# Altium footprint library PcbLib.PcbLib: 108 footprints (part 1 of 7)
Each footprint in its own frame and in the unit in brackets; x right, y up, seen from the top. Pads: shape width x height; smd on the part's side, far side on the other; paste and mask are expansions set on the pad; w line width, h text height; cw(c..) or ccw(c..) is an arc to the next point about the centre after c.
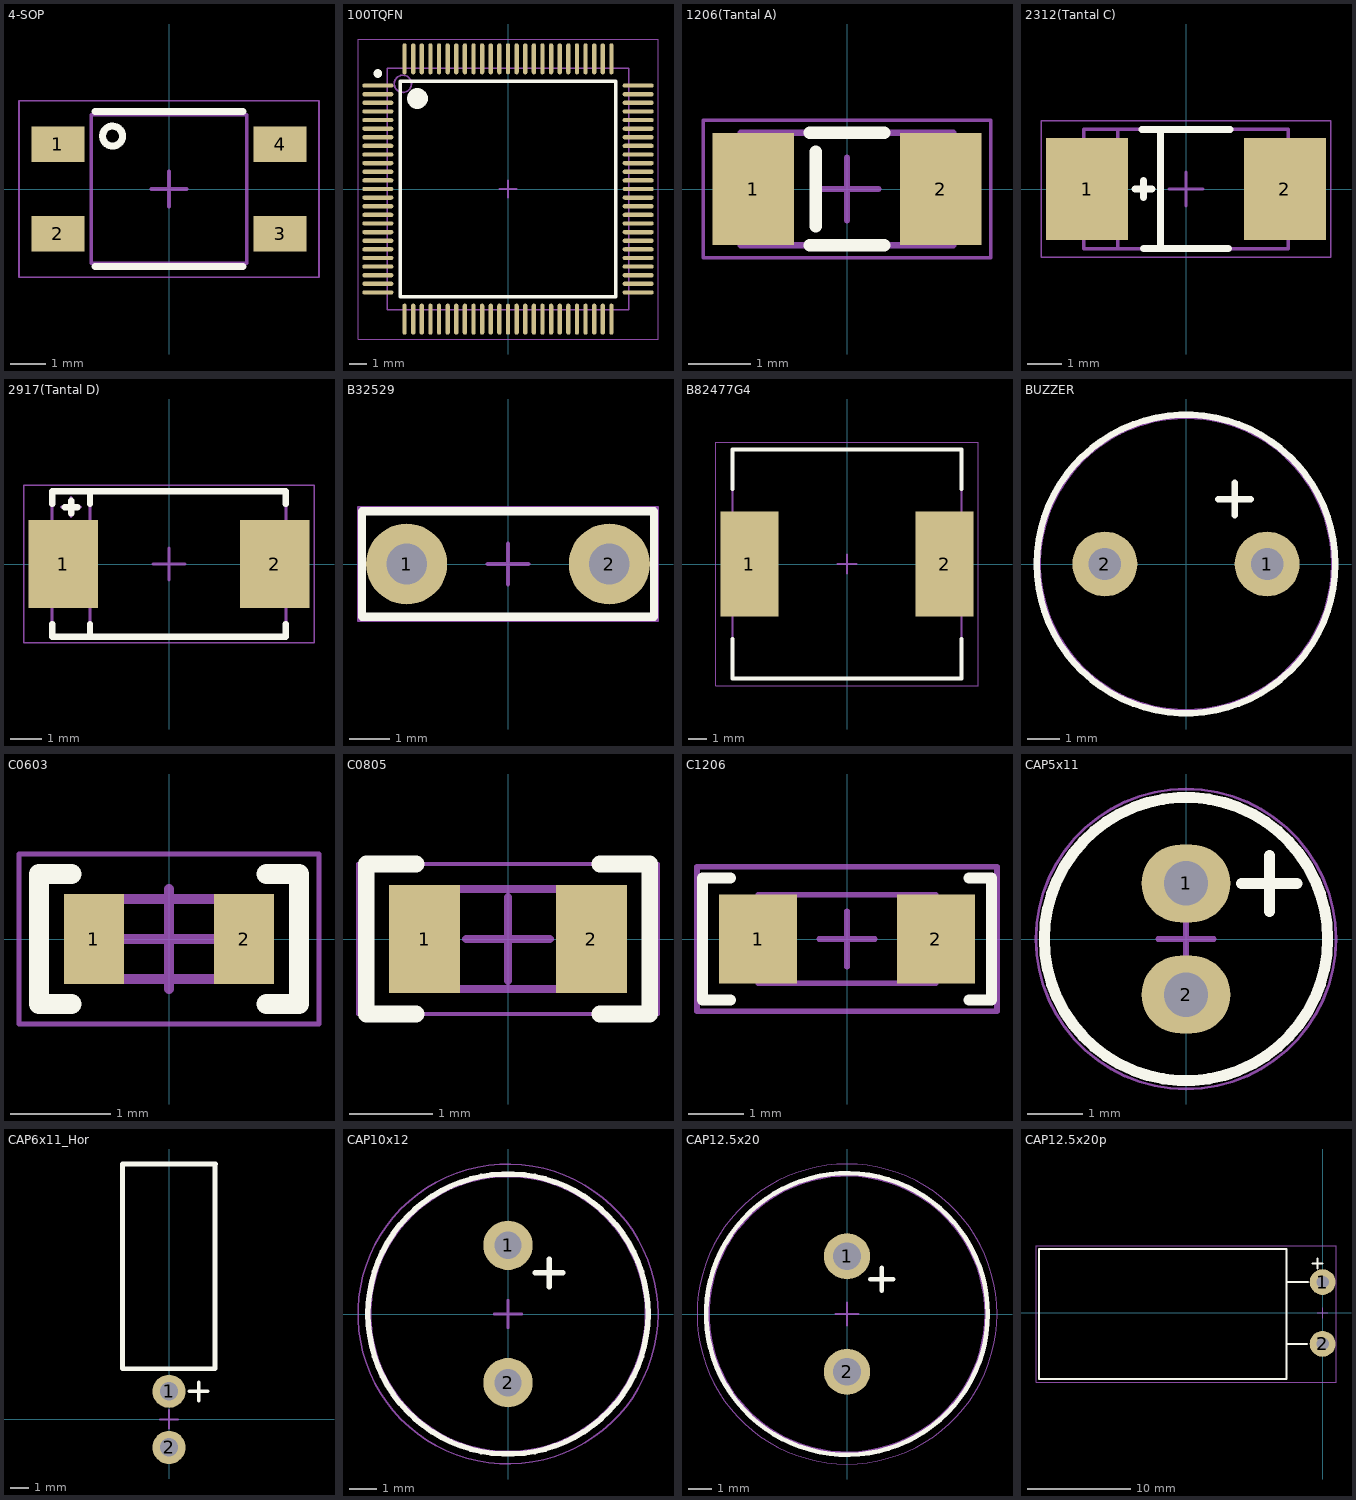
[diagram p0: the footprints below, top view; thin cyan lines are the x and y axes]

## 4-SOP [mm]
height 2
pads (4):
  rect 1.5x1 smd: 1(-3.15,1.27) 2(-3.15,-1.27) 3(3.15,-1.27) 4(3.15,1.27)
Top Overlay:
  circle w0.2: c-1.6,1.5 r0.283
  lines w0.2: -2.1,-2.2 2.1,-2.2 ; -2.1,2.2 2.1,2.2
Mechanical 13:
  lines w0.05: -4.25,-2.5 -4.25,2.5 4.25,2.5 4.25,-2.5 -4.25,-2.5
  lines w0.1: -0.5,0 0.5,0 ; 0,-0.5 0,0.5
Mechanical 14:
  circle w0.1: c-1.6,1.5 r0.3
  lines w0.1: -2.2,-2.1 2.2,-2.1 2.2,2.1 -2.2,2.1 -2.2,-2.1
3D body "4-SOP.STEP": height 2.1, standoff 0, extent -3.4,-2.15 3.4,2.15

## 100TQFN [mm] "Thin QFP, 100-Leads, Body 14x14mm, Pitch 0.5mm, IPC Medium Density"
height 1.2
pads (100):
  oval 1.8x0.25 smd: 1(-7.55,6) 2(-7.55,5.5) 3(-7.55,5) 4(-7.55,4.5) 5(-7.55,4) 6(-7.55,3.5) 7(-7.55,3) 8(-7.55,2.5) 9(-7.55,2) 10(-7.55,1.5) 11(-7.55,1) 12(-7.55,0.5) 13(-7.55,0) 14(-7.55,-0.5) 15(-7.55,-1) 16(-7.55,-1.5) 17(-7.55,-2) 18(-7.55,-2.5) 19(-7.55,-3) 20(-7.55,-3.5) 21(-7.55,-4) 22(-7.55,-4.5) 23(-7.55,-5) 24(-7.55,-5.5) 25(-7.55,-6) 51(7.55,-6) 52(7.55,-5.5) 53(7.55,-5) 54(7.55,-4.5) 55(7.55,-4) 56(7.55,-3.5) 57(7.55,-3) 58(7.55,-2.5) 59(7.55,-2) 60(7.55,-1.5) 61(7.55,-1) 62(7.55,-0.5) 63(7.55,0) 64(7.55,0.5) 65(7.55,1) 66(7.55,1.5) 67(7.55,2) 68(7.55,2.5) 69(7.55,3) 70(7.55,3.5) 71(7.55,4) 72(7.55,4.5) 73(7.55,5) 74(7.55,5.5) 75(7.55,6)
  oval 0.25x1.8 smd: 26(-6,-7.55) 27(-5.5,-7.55) 28(-5,-7.55) 29(-4.5,-7.55) 30(-4,-7.55) 31(-3.5,-7.55) 32(-3,-7.55) 33(-2.5,-7.55) 34(-2,-7.55) 35(-1.5,-7.55) 36(-1,-7.55) 37(-0.5,-7.55) 38(0,-7.55) 39(0.5,-7.55) 40(1,-7.55) 41(1.5,-7.55) 42(2,-7.55) 43(2.5,-7.55) 44(3,-7.55) 45(3.5,-7.55) 46(4,-7.55) 47(4.5,-7.55) 48(5,-7.55) 49(5.5,-7.55) 50(6,-7.55) 76(6,7.55) 77(5.5,7.55) 78(5,7.55) 79(4.5,7.55) 80(4,7.55) 81(3.5,7.55) 82(3,7.55) 83(2.5,7.55) 84(2,7.55) 85(1.5,7.55) 86(1,7.55) 87(0.5,7.55) 88(0,7.55) 89(-0.5,7.55) 90(-1,7.55) 91(-1.5,7.55) 92(-2,7.55) 93(-2.5,7.55) 94(-3,7.55) 95(-3.5,7.55) 96(-4,7.55) 97(-4.5,7.55) 98(-5,7.55) 99(-5.5,7.55) 100(-6,7.55)
Top Overlay:
  circle w0.6: c-5.25,5.25 r0.3
  circle w0.25: c-7.55,6.7 r0.125
  lines w0.2: -6.25,-6.25 6.25,-6.25 6.25,6.25 -6.25,6.25 -6.25,-6.25
Mechanical 13:
  lines w0.05: -8.7,-8.7 -8.7,8.7 8.7,8.7 8.7,-8.7 -8.7,-8.7
  lines w0.1: -0.5,0 0.5,0 ; 0,-0.5 0,0.5
Mechanical 14:
  circle w0.1: c-6.1,6.1 r0.5
  lines w0.1: -7,-7 7,-7 7,7 -7,7 -7,-7
3D body "User Library-100A-14x14.step": height 1.15, standoff 0.05, extent -8,-8 8,8

## 1206(Tantal A) [mm]
height 1.8
pads (2):
  rect 1.3x1.8 smd: 1(-1.5,0) 2(1.5,0)
Top Overlay:
  lines w0.2: -0.6,-0.9 0.6,-0.9 ; -0.6,0.9 0.6,0.9 ; -0.5,-0.6 -0.5,0.6
Mechanical 13:
  lines w0.05: -2.3,-1.1 2.3,-1.1 2.3,1.1 -2.3,1.1 -2.3,-1.1
  lines w0.1: -0.5,0 0.5,0 ; 0,-0.5 0,0.5
Mechanical 14:
  lines w0.1: -1,-0.9 -1,0.9 ; -1.7,-0.9 1.7,-0.9 1.7,0.9 -1.7,0.9 -1.7,-0.9
3D body "CAP_TANT_1206_A_case.step": height 1.7, standoff 0, extent -1.7,-0.9 1.7,0.9

## 2312(Tantal C) [mm]
height 2.9
pads (2):
  rect 2.4x3 smd: 1(-2.9,0) 2(2.9,0)
Top Overlay:
  lines w0.2: -1.5,0 -1,0 ; -1.3,1.75 1.3,1.75 ; -1.25,-1.75 1.25,-1.75 ; -1.25,-0.25 -1.25,0.25 ; -0.75,-1.75 -0.75,1.75
Mechanical 13:
  lines w0.05: -4.25,-2 4.25,-2 4.25,2 -4.25,2 -4.25,-2
  lines w0.1: -0.5,0 0.5,0 ; 0,-0.5 0,0.5
Mechanical 14:
  lines w0.1: -2,-1.75 -2,1.75 ; -1.5,0 -1,0 ; -1.25,-0.25 -1.25,0.25 ; -3,-1.75 3,-1.75 3,1.75 -3,1.75 -3,-1.75
3D body "CAP_TANT_C.step": height 2.6, standoff 0, extent -2.9,-1.6 2.9,1.6

## 2917(Tantal D) [mm]
height 2.9
pads (2):
  rect 2.2x2.8 smd: 1(-3.35,0) 2(3.35,0)
Top Overlay:
  lines w0.2: -3.7,-1.9 -3.7,-2.3 3.7,-2.3 3.7,-1.9 ; -3.7,1.9 -3.7,2.3 3.7,2.3 3.7,1.9 ; -3.3,1.8 -2.9,1.8 ; -3.1,1.6 -3.1,2 ; -2.5,-2.3 -2.5,-1.9 ; -2.5,1.9 -2.5,2.3
Mechanical 13:
  lines w0.05: -4.6,-2.5 4.6,-2.5 4.6,2.5 -4.6,2.5 -4.6,-2.5
  lines w0.1: -0.5,0 0.5,0 ; 0,-0.5 0,0.5
Mechanical 14:
  lines w0.1: -3.4,1.8 -2.8,1.8 ; -3.1,1.5 -3.1,2.1 ; -2.5,-2.3 -2.5,2.3 ; -3.7,-2.3 3.7,-2.3 3.7,2.3 -3.7,2.3 -3.7,-2.3
3D body "2917D_CASE.step": height 3.01, standoff 0, extent -3.7,-2.225 3.7,2.225

## B32529 [mm]
height 6.5
pads (2):
  round 2 hole 1: 1(-2.5,0) 2(2.5,0)
Top Overlay:
  lines w0.2: -3.6,-1.3 3.6,-1.3 3.6,1.3 -3.6,1.3 -3.6,-1.3
Mechanical 13:
  lines w0.05: -3.7,-1.4 -3.7,1.4 3.7,1.4 3.7,-1.4 -3.7,-1.4
  lines w0.1: -0.5,0 0.5,0 ; 0,-0.5 0,0.5
Mechanical 14:
  lines w0.1: -3.6,-1.3 3.6,-1.3 3.6,1.3 -3.6,1.3 -3.6,-1.3
3D body "User Library-B32529-2_5X6_5X7_2.STEP": height 6.5, standoff -3, extent -3.6,-1.25 3.6,1.25

## B82477G4 [mm]
height 8
pads (2):
  rect 3.1x5.6 smd: 1(-5.2,0) 2(5.2,0)
Top Overlay:
  lines w0.2: -6.1,-4 -6.1,-6.1 6.1,-6.1 6.1,-4 ; -6.1,4 -6.1,6.1 6.1,6.1 6.1,4
Mechanical 13:
  lines w0.05: -7,-6.5 -7,6.5 7,6.5 7,-6.5 -7,-6.5
  lines w0.1: -0.5,0 0.5,0 ; 0,-0.5 0,0.5
Mechanical 14:
  lines w0.1: -6.1,-6.1 -6.1,6.1 6.1,6.1 6.1,-6.1 -6.1,-6.1
3D body "User Library-CDRH127-2.step": height 8, standoff 0, extent -6,-6 6,6

## BUZZER [mm]
height 8
pads (2):
  round 2 hole 1: 1(2.5,0) 2(-2.5,0)
Top Overlay:
  circle w0.2: c0,0 r4.6
  lines w0.2: 1,2 2,2 ; 1.5,1.5 1.5,2.5
Mechanical 13:
  circle w0.05: c0,0 r4.623
Mechanical 14:
  circle w0.1: c0,0 r4.519
3D body "Buzzer_9mm.STEP": height 5.7, standoff -5.3, extent -4.55,-4.55 4.55,4.55

## C0603 [mm]
height 1
pads (2):
  rect 0.6x0.9 smd: 1(-0.75,0) 2(0.75,0)
Top Overlay:
  lines w0.2: -0.975,-0.65 -1.3,-0.65 -1.3,0.65 -0.975,0.65 ; 0.975,-0.65 1.3,-0.65 1.3,0.65 0.975,0.65
Mechanical 13:
  lines w0.05: -1.5,-0.85 1.5,-0.85 1.5,0.85 -1.5,0.85 -1.5,-0.85
  lines w0.1: -0.5,0 0.5,0 ; 0,-0.5 0,0.5
Mechanical 14:
  lines w0.1: -0.8,-0.4 0.7,-0.4 0.7,0.4 -0.8,0.4 -0.8,-0.4
3D body "User Library-cap_0603-1.step": height 0.8, standoff 0, extent -0.8,-0.4 0.8,0.4

## C0805 [mm]
height 1
pads (2):
  rect 0.85x1.3 smd: 1(-1,0) 2(1,0)
Top Overlay:
  lines w0.2: -1.1,-0.9 -1.7,-0.9 -1.7,0.9 -1.1,0.9 ; 1.1,-0.9 1.7,-0.9 1.7,0.9 1.1,0.9
Mechanical 13:
  lines w0.05: -1.8,-0.9 -1.8,0.9 1.8,0.9 1.8,-0.9 -1.8,-0.9
  lines w0.1: -0.5,0 0.5,0 ; 0,-0.5 0,0.5
Mechanical 14:
  lines w0.1: -1,-0.6 -1,0.6 1,0.6 1,-0.6 -1,-0.6
3D body "CircuitWorks-cap0805.step": height 0.6, standoff 0, extent -1,-0.625 1,0.625

## C1206 [mm]
height 1.25
pads (2):
  rect 1.4x1.6 smd: 1(-1.6,0) 2(1.6,0)
Top Overlay:
  lines w0.2: -2.1,-1.1 -2.6,-1.1 -2.6,1.1 -2.1,1.1 ; 2.2,-1.1 2.6,-1.1 2.6,1.1 2.2,1.1
Mechanical 13:
  lines w0.1: -0.5,0 0.5,0 ; 0,-0.5 0,0.5 ; -2.7,-1.3 -2.7,1.3 2.7,1.3 2.7,-1.3 -2.7,-1.3
Mechanical 14:
  lines w0.1: -1.6,-0.8 1.6,-0.8 1.6,0.8 -1.6,0.8 -1.6,-0.8
3D body "User Library-cap_1206_1_25.step": height 1.25, standoff 0, extent -1.6,-0.8 1.6,0.8

## CAP5x11 [mm] "2mm Pitch"
height 11.5
pads (2):
  oval 1.6x1.4 hole 0.8: 1(0,1) 2(0,-1)
Top Overlay:
  circle w0.2: c0,0 r2.55
  lines w0.2: 1,1 2,1 ; 1.5,0.5 1.5,1.5
Mechanical 13:
  circle w0.05: c0,0 r2.7
  lines w0.1: -0.5,0 0.5,0 ; 0,-0.5 0,0.5
Mechanical 14:
  circle w0.1: c0,0 r2.55
3D body "Cap-EL(5x11-2)T.step": height 11.35, standoff -2.45, extent -2.499,-2.502 2.499,2.5

## CAP6x11_Hor [mm] "2mm Pitch"
height 11.5
pads (2):
  round 1.8 hole 1: 1(0,1.525) 2(0,-1.525)
Top Overlay:
  lines w0.2: 1.1,1.525 2.1,1.525 ; 1.625,1.025 1.625,2.025
  lines w0.254: -2.525,2.75 -2.525,13.875 2.525,13.875 2.5,13.85 2.5,2.75 -2.525,2.75
Mechanical 13:
  lines w0.1: -0.5,0 0.5,0 ; 0,-0.5 0,0.5
3D body "Cap-EL(5x11-2)T.step": height 5.5, standoff 0.5, extent -2.498,0.15 2.498,13.952

## CAP10x12 [mm]
height 12.5
pads (2):
  round 1.8 hole 1: 1(0,2.5) 2(0,-2.5)
Top Overlay:
  circle w0.2: c0,0 r5.099
  lines w0.2: 1,1.5 2,1.5 ; 1.5,1 1.5,2
Mechanical 13:
  circle w0.05: c0,0 r5.46
  lines w0.1: -0.5,0 0.5,0 ; 0,-0.5 0,0.5
Mechanical 14:
  circle w0.1: c0,0 r5.025
3D body "Cap-EL(10x12-5)T.step": height 12.6, standoff -3.4, extent -5,-5.002 5,5

## CAP12.5x20 [mm] "5mm Pitch"
height 21
pads (2):
  round 2 hole 1.2: 1(0,2.5) 2(0,-2.5)
Top Overlay:
  circle w0.2: c0,0 r6.1
  lines w0.2: 1,1.5 2,1.5 ; 1.5,1 1.5,2
Mechanical 13:
  circle w0.05: c0,0 r6.5
  lines w0.1: -0.5,0 0.5,0 ; 0,-0.5 0,0.5
Mechanical 14:
  circle w0.1: c0,0 r6
3D body "Cap-EL(12_5x20-5)T.step": height 20.6, standoff -3.4, extent -6.25,-6.252 6.25,6.25

## CAP12.5x20p [mm] "5mm Pitch"
height 21
pads (2):
  round 2.5 hole 1.2: 1(0,3) 2(0,-3)
Top Overlay:
  lines w0.2: -3.5,-3 -1.5,-3 ; -1.4,3 -3.5,3 ; -1,4.8 0,4.8 ; -0.5,4.3 -0.5,5.3 ; -3.5,3 -3.5,6.2 -27.5,6.2 -27.5,-6.4 -3.5,-6.4 -3.5,3
Mechanical 13:
  lines w0.05: -27.8,-6.7 1.3,-6.7 1.3,6.5 1,6.5 -27.8,6.5 -27.8,-6.7
  lines w0.1: -0.5,0 0.5,0 ; 0,-0.5 0,0.5
3D body "Cap-EL(12_5x20-5)T.step": height 13.25, standoff 0.75, extent -23.602,-6.352 0.4,6.15